# Altium schematic symbol library SCHLIB.SchLib: 2608 symbols (part 6 of 20)
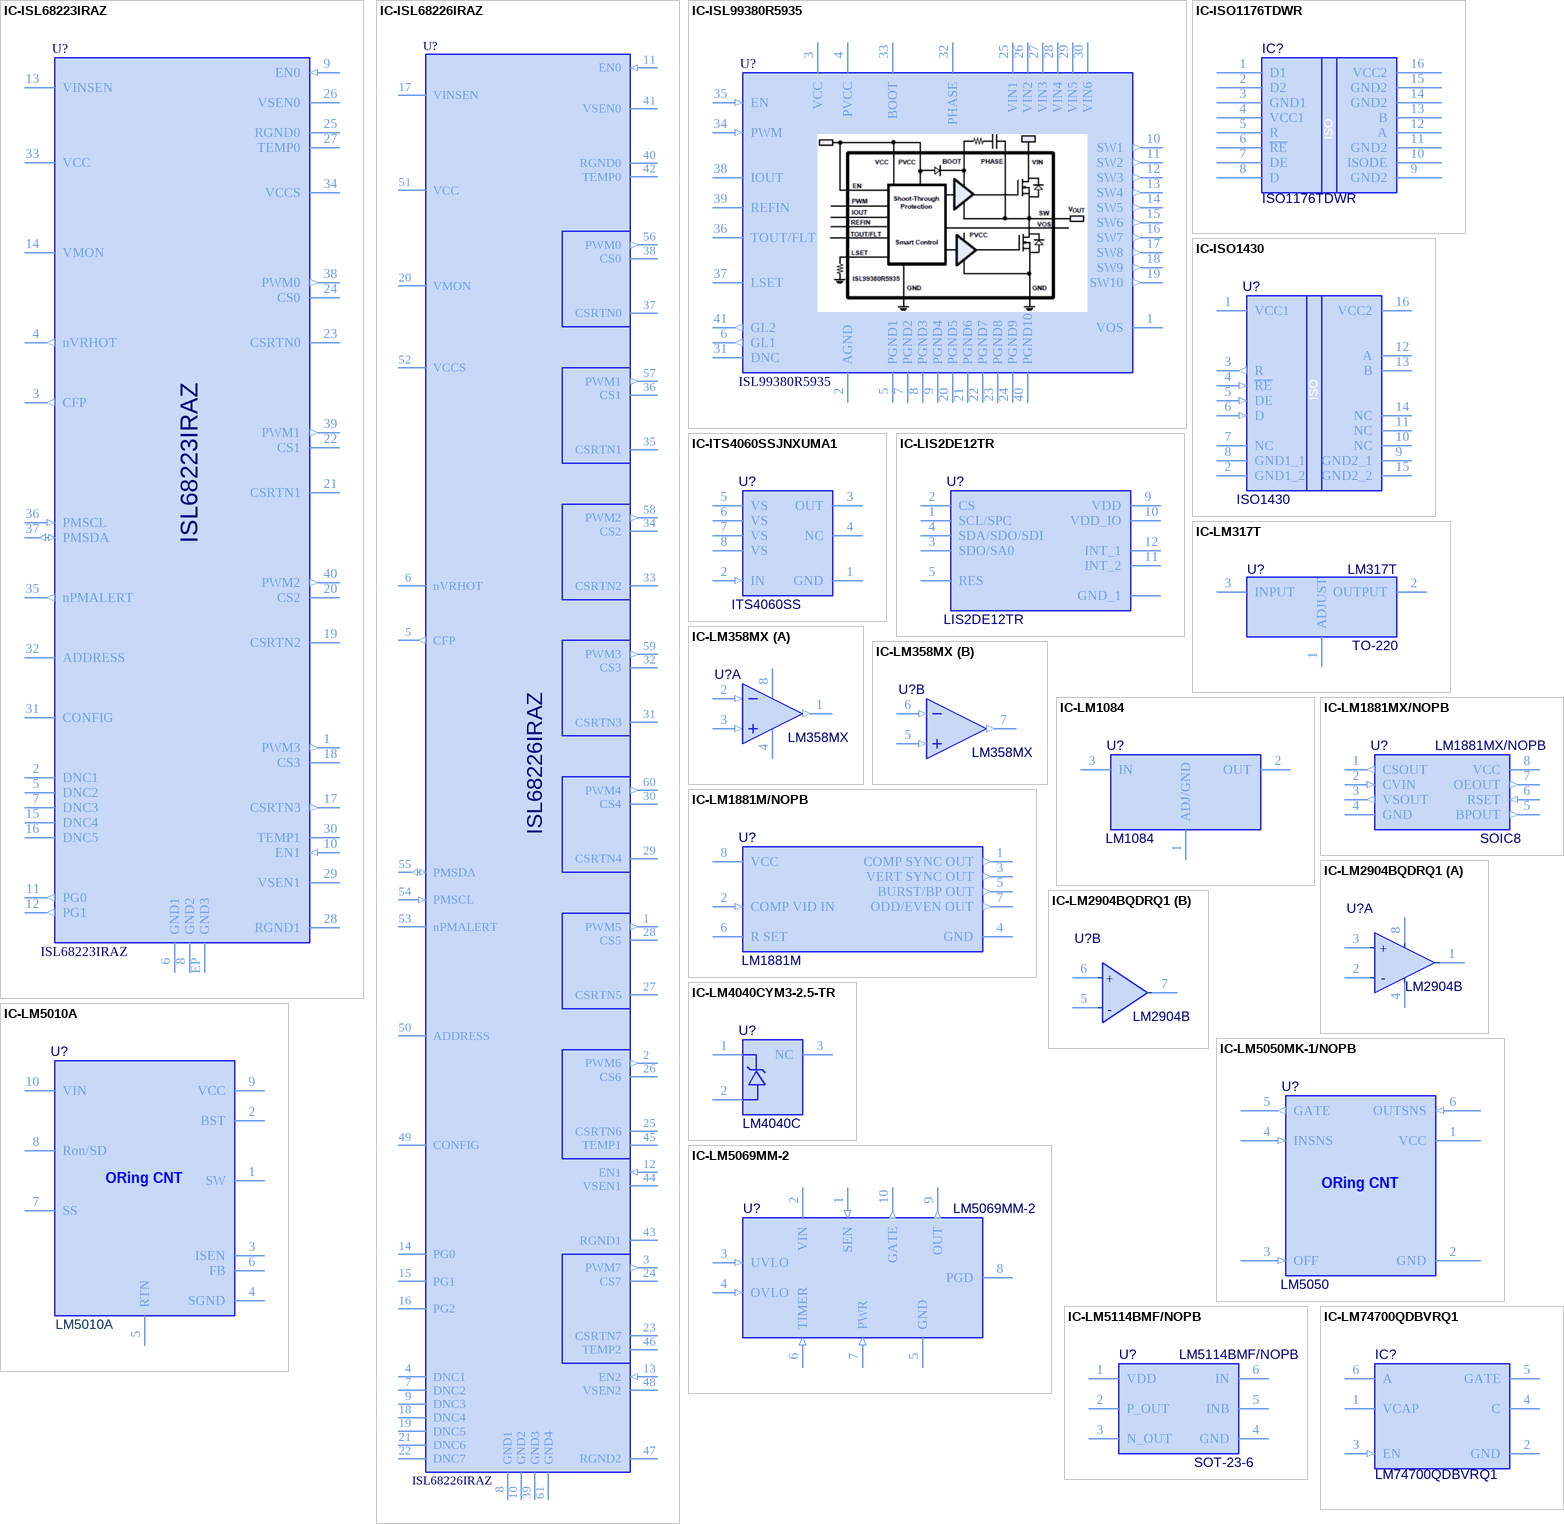
[diagram p88: symbols IC-ISL68223IRAZ to IC-LM74700QDBVRQ1]

## IC-LM358MX
designator U?, comment LM358MX
IC OPAMP GP 8SOIC; Manufacturer: ON Semiconductor / Fairchild; Min Supply Voltage: 3V; Max Supply Voltage: 32V; Min Dual Supply Voltage: 1.5V; Max Dual Supply Voltage: 16V; Voltage Gain: 100dB; Slew Rate: 0.6V/µs; Number of Channels: 2; Common Mode Rejection Ratio: 65dB; Output Current: 30mA; Nominal Supply Current: 1.2mA; Input Bias Current: 250nA; Input Offset Voltage (Vos): 7mV; Operating Supply Current: 800uA; Washability: OK; Supplier 1: Digi-Key; Manufacturer Part Number: LM358MX; Stock 1: 16179; Pricing 1: 1=0.47, 10=0.379, 100=0.2578, 500=0.19332, 1000=0.14499 (USD); Mount: Surface Mount; Number of Pins: 8; Weight: 0.2304g; Min Operating Temperature: 0°C; Max Operating Temperature: 70°C; Packaging: Tape and Reel; Package Quantity: 3000; Operating Supply Voltage: 32V; Number of Circuits: 2; Number of Elements: 2; Power Supply Rejection Ratio (PSRR): 65dB; Number of Amplifiers: 2; Output Current per Channel: 30mA; Length: 4.92mm; Height: 1.55mm; Width: 3.95mm; Radiation Hardening: No; REACH SVHC: No SVHC; Lead Free: Lead Free; Supplier Part Number 1: LM358MXFSDKR-ND; ComponentLink1Description: Datasheet; ComponentLink1URL: https://www.ti.com/lit/ds/symlink/lm158-n.pdf
footprint SOIC8
part A pins: 1 OUT A (out), 2 -IN A (in), 3 +IN A (in), 4 -V (power), 8 +V (power)
part B pins: 5 +IN A (in), 6 -IN A (in), 7 OUT B (out)
1 alternate drawing of the same symbol

## IC-LM1084
designator U?, comment LM1084
IC REG LIN POS ADJ 5A DDPAK; Manufacturer: TI National Semiconductor; Manufacturer Part Number: LM1084IS-ADJ/NOPB; Max Power Dissipation: 30W; Max Input Voltage: 29V; Dropout Voltage: 1.3V; Output Voltage: 15V; Number of Outputs: 1; Min Input Voltage: 2.6V; Reference Voltage: 1.262V; Polarity: Positive; Min Output Voltage: 1.25V; Quiescent Current: 5mA; Output Type: Adjustable; Supplier 1: Digi-Key; Stock 1: 299; Pricing 1: 1=2,85000, 10=2,55600, 25=2,41640, 100=1,98690, 250=1,78284, 500=1,71840, 1000=1,42842, 2500=1,37472, 5000=1,33176 (USD); RoHS: Yes; Mount: Surface Mount; Case/Package: TO-263; Number of Pins: 3; Weight: 0.25lb; Contact Plating: Tin,Matte; Min Operating Temperature: -40°C; Max Operating Temperature: 125°C; Packaging: Rail/Tube; Output Current: 5A; Max Output Current: 5A; Package Quantity: 45; Power Dissipation: 30W; Max Output Voltage: 15V; Current Rating: 5A; Length: 10.16mm; Height: 4.57mm; Width: 8.64mm; Radiation Hardening: No; REACH SVHC: No SVHC; Lead Free: Contains Lead; ComponentLink1URL: https://datasheet.ciiva.com/27050/835577-27050272.pdf?src-supplier=Jameco; ComponentLink1Description: https://datasheet.ciiva.com/27050/835577-27050272.pdf?src-supplier=Jameco; ComponentLink2URL: https://datasheet.ciiva.com/25626/0900766b807800b5-25626829.pdf?src-supplier=RSComponents; ComponentLink2Description: https://datasheet.ciiva.com/25626/0900766b807800b5-25626829.pdf?src-supplier=RSComponents; ComponentLink3URL: https://datasheet.ciiva.com/1511/1887482-1511673.pdf?src-supplier=Element14; ComponentLink3Description: https://datasheet.ciiva.com/1511/1887482-1511673.pdf?src-supplier=Element14; ComponentLink4URL: https://datasheet.ciiva.com/25974/lm1084-25974378.pdf?src-supplier=Avnet+Europe; ComponentLink4Description: https://datasheet.ciiva.com/25974/lm1084-25974378.pdf?src-supplier=Avnet+Europe; ComponentLink5URL: https://datasheet.ciiva.com/3223/lm1084-3223471.pdf?src-supplier=Avnet; ComponentLink5Description: https://datasheet.ciiva.com/3223/lm1084-3223471.pdf?src-supplier=Avnet; Supplier Part Number 1: LM1084IS-ADJ/NOPB-ND
footprint DPAK254P1404X457-4N
pins: 1 ADJ/GND, 2 OUT, 3 IN

## IC-LM1881M/NOPB
designator U?, comment LM1881M
IC VIDEO SYNC SEPARATOR 8SOIC; Manufacturer: TI National Semiconductor; Manufacturer Part Number: LM1881M/NOPB; Min Supply Voltage: 5V; Max Supply Voltage: 12V; Nominal Supply Current: 5.2mA; Power Dissipation: 1.1W; Power Consumption: 25mW; Washability: OK; Supplier 1: Digi-Key; Supplier Part Number 1: LM1881M/NOPB-ND; Stock: 529; Pricing: 1=3.61, 10=3.246, 25=3.0692, 100=2.5234, 250=2.2642, 500=2.1824, 1000=1.8141, 2500=1.7459, 5000=1.6914 (USD); RoHS: Yes; Mount: Surface Mount; Case/Package: SOIC; Number of Pins: 8; Contact Plating: Tin,Matte; Min Operating Temperature: 0°C; Max Operating Temperature: 70°C; Packaging: Rail/Tube; Package Quantity: 95; Voltage: 5V; Max Power Dissipation: 1.1W; Length: 4.9mm; Height: 1.45mm; Width: 3.9mm; Radiation Hardening: No; REACH SVHC: No SVHC; Lead Free: Lead Free; ComponentLink1URL: https://datasheet.ciiva.com/14153/sanat-semico-video-sync-seperator-en-14153233.pdf?src-supplier=Distrelec; ComponentLink1Description: https://datasheet.ciiva.com/14153/sanat-semico-video-sync-seperator-en-14153233.pdf?src-supplier=Distrelec; ComponentLink2URL: https://datasheet.ciiva.com/1172/1839177-1172294.pdf?src-supplier=Element14; ComponentLink2Description: https://datasheet.ciiva.com/1172/1839177-1172294.pdf?src-supplier=Element14; ComponentLink3URL: https://datasheet.ciiva.com/19457/893996-19457288.pdf?src-supplier=Jameco; ComponentLink3Description: https://datasheet.ciiva.com/19457/893996-19457288.pdf?src-supplier=Jameco; ComponentLink4URL: https://datasheet.ciiva.com/15120/getdatasheetpartid-628221-15120012.pdf?src-supplier=Verical; ComponentLink4Description: https://datasheet.ciiva.com/15120/getdatasheetpartid-628221-15120012.pdf?src-supplier=Verical; ComponentLink5URL: https://datasheet.ciiva.com/6622/lm1881-6622173.pdf?src-supplier=Digi-Key; ComponentLink5Description: https://datasheet.ciiva.com/6622/lm1881-6622173.pdf?src-supplier=Digi-Key; ComponentLink6URL: https://datasheet.ciiva.com/48707/001010689-da-01-en-ic-video-sync-se-lm1881m-nopb-soic-8-tid-48707237.pdf?src-supplier=Conrad; ComponentLink6Description: https://datasheet.ciiva.com/48707/001010689-da-01-en-ic-video-sync-se-lm1881m-nopb-soic-8-tid-48707237.pdf?src-supplier=Conrad
footprint D0008A_N (SOIC, 8-Leads, Body 5x4mm, Pitch 1.27mm, IPC Medium Density)
pins: 1 COMP SYNC OUT (out), 2 COMP VID IN (in), 3 VERT SYNC OUT (out), 4 GND (power), 5 BURST/BP OUT (out), 6 R SET, 7 ODD/EVEN OUT (out), 8 VCC (power)

## IC-LM1881MX/NOPB
designator U?, comment LM1881MX/NOPB  Case/Package: SOIC8
IC VIDEO SYNC SEPARATOR 8-SOIC; Manufacturer: TI National Semiconductor; Max Supply Voltage: 5V; Max Power Dissipation: 1.1W; Operating Supply Current: 5.2mA; Power Consumption: 25mW; Washability: OK; Supplier 1: Digi-Key; Manufacturer Part Number: LM1881MX/NOPB; Stock 1: 9639; Pricing 1: 1=3.13, 10=2.809, 100=2.3017, 500=1.95944, 1000=1.65253 (USD); Mount: Surface Mount; Number of Pins: 8; Weight: 0.019048oz; Contact Plating: Tin; Min Operating Temperature: 0°C; Max Operating Temperature: 70°C; Packaging: Tape and Reel; Package Quantity: 2500; Radiation Hardening: No; REACH SVHC: No SVHC; Lead Free: Lead Free; ComponentLink1URL: https://www.verical.com/server-webapp/html/getDatasheet?partID=630017; ComponentLink1Description: https://www.verical.com/server-webapp/html/getDatasheet?partID=630017; ComponentLink2URL: http://www.ti.com/lit/ds/symlink/lm1881.pdf; ComponentLink2Description: http://www.ti.com/lit/ds/symlink/lm1881.pdf; Supplier Part Number 1: 296-47437-6-ND
footprint SOIC8
pins: 1 CSOUT (out), 2 CVIN (in), 3 VSOUT (out), 4 GND (power), 5 BPOUT (out), 6 RSET (in), 7 OEOUT (out), 8 VCC (power)

## IC-LM2904BQDRQ1
designator U?, comment LM2904B
IC OPAMP GP 2 CIRCUIT 8SOIC; Manufacturer: Texas Instruments; Manufacturer Part Number: LM2904BQDRQ1; Supplier 1: Digi-Key; Supplier Part Number 1: 296-LM2904BQDRQ1CT-ND; Stock: 1587; Pricing: 1=0.44, 10=0.375, 25=0.35, 100=0.26, 250=0.22, 500=0.21, 1000=0.155 (USD); RoHS: No; ComponentLink1Description: datasheet; ComponentLink1URL: https://www.ti.com/lit/ds/symlink/lm2904-q1.pdf?HQS=TI-null-null-digikeymode-df-pf-null-wwe&ts=1602145041041
footprint SOIC8-D0008A_M (SOIC, 8-Leads, Body 5x4mm, Pitch 1.27mm, IPC Low Density)
part A pins: 1 OUT1, 2 IN1- (hiz), 3 IN1+ (hiz), 4 V- (power), 8 V+ (power)
part B pins: 5 IN2+ (hiz), 6 IN2- (hiz), 7 OUT2
part A text: +; -
part B text: +; -

## IC-LM4040CYM3-2.5-TR
designator U?, comment LM4040C
IC VREF SHUNT 0.5% SOT23-3; Manufacturer: Microchip; Manufacturer Part Number: LM4040CYM3-2.5-TR; Min Output Voltage: 2.5V; Output Current: 15mA; Temperature Coefficient: 100ppm/°C; Cathode Current: 65uA; Number of Channels: 1; Output Type: Fixed; Supplier 1: Digi-Key; Supplier Part Number 1: 576-1046-1-ND; Stock: 8428; Pricing: 1=0.32, 25=0.26, 100=0.24 (USD); RoHS: Yes; Mount: Surface Mount; Case/Package: TO-236-3; Number of Pins: 3; Min Operating Temperature: -40°C; Max Operating Temperature: 85°C; Packaging: Cut Tape; Reference Voltage: 2.5V; Tolerance: 0.5%; Output Voltage: 2.5V; Reference Type: Shunt; REACH SVHC: No SVHC; Lead Free: Lead Free; ComponentLink1URL: https://datasheet.ciiva.com/16388/mic23051-16388546.pdf?src-supplier=Future+Electronics; ComponentLink1Description: https://datasheet.ciiva.com/16388/mic23051-16388546.pdf?src-supplier=Future+Electronics; ComponentLink2URL: https://datasheet.ciiva.com/1173/1580463-1173207.pdf?src-supplier=Element14; ComponentLink2Description: https://datasheet.ciiva.com/1173/1580463-1173207.pdf?src-supplier=Element14
footprint SOT23-3
pins: 1 +, 2 -, 3 NC

## IC-LM5010A
designator U?, comment LM5010A
IC REG BUCK ADJUSTABLE 1A 10WSON; Manufacturer: TI National Semiconductor; Manufacturer Part Number: LM5010ASD/NOPB; Output Voltage: 70V; Switching Frequency: 1MHz; Number of Outputs: 1; Efficiency: 91%; Min Input Voltage: 6V; Max Input Voltage: 75V; Synchronous Rectifier: No; Min Output Voltage: 2.5V; Quiescent Current: 650uA; Supplier 1: Digi-Key; Stock 1: 6898; Pricing 1: 1=3,43000, 10=3,08000, 25=2,91160, 100=2,39390, 250=2,14804, 500=2,07040 (USD); RoHS: Yes; Mount: Surface Mount; Number of Pins: 10; Contact Plating: Tin,Matte; Min Operating Temperature: -40°C; Max Operating Temperature: 150°C; Max Output Current: 1A; Output Current: 1A; Package Quantity: 1000; Packaging: Tape and Reel; Max Output Voltage: 70V; Output Type: Adjustable; Max Supply Voltage: 75V; Min Supply Voltage: 6V; Frequency: 1MHz; Termination: SMD/SMT; Length: 4mm; Height: 0.8mm; Width: 4mm; Radiation Hardening: No; Lead Free: Lead Free; REACH SVHC: No SVHC; ComponentLink1URL: https://datasheet.ciiva.com/22755/1814939-22755746.pdf?src-supplier=Farnell; ComponentLink1Description: https://datasheet.ciiva.com/22755/1814939-22755746.pdf?src-supplier=Farnell; ComponentLink2URL: https://datasheet.ciiva.com/25627/0900766b810fa582-25627522.pdf?src-supplier=RSComponents; ComponentLink2Description: https://datasheet.ciiva.com/25627/0900766b810fa582-25627522.pdf?src-supplier=RSComponents; ComponentLink3URL: https://datasheet.ciiva.com/27052/1471525-27052267.pdf?src-supplier=Jameco; ComponentLink3Description: https://datasheet.ciiva.com/27052/1471525-27052267.pdf?src-supplier=Jameco; ComponentLink4URL: https://datasheet.ciiva.com/6597/lm5010a-6597237.pdf?src-supplier=Digi-Key; ComponentLink4Description: https://datasheet.ciiva.com/6597/lm5010a-6597237.pdf?src-supplier=Digi-Key; ComponentLink5URL: https://datasheet.ciiva.com/22684/1886233-22684613.pdf?src-supplier=Element14; ComponentLink5Description: https://datasheet.ciiva.com/22684/1886233-22684613.pdf?src-supplier=Element14; ComponentLink6URL: https://datasheet.ciiva.com/6597/lm5010a-6597240.pdf?src-supplier=Digi-Key; ComponentLink6Description: https://datasheet.ciiva.com/6597/lm5010a-6597240.pdf?src-supplier=Digi-Key; ComponentLink7URL: https://datasheet.ciiva.com/3229/lm5010a-3229963.pdf?src-supplier=Avnet; ComponentLink7Description: https://datasheet.ciiva.com/3229/lm5010a-3229963.pdf?src-supplier=Avnet; ComponentLink8URL: https://datasheet.ciiva.com/6597/lm5010a-6597243.pdf?src-supplier=Digi-Key; ComponentLink8Description: https://datasheet.ciiva.com/6597/lm5010a-6597243.pdf?src-supplier=Digi-Key; Supplier Part Number 1: 296-LM5010ASD/NOPBCT-ND
footprint SON80P400X80_HS-11N (SON, 10-Leads, Body 4,00x4,00mm, Pitch 0,80mm, Thermal Pad 3,00x2,09mm, IPC Medium Density)
pins: 1 SW, 2 BST, 3 ISEN, 4 SGND, 5 RTN, 6 FB, 7 SS, 8 Ron/SD, 9 VCC, 10 VIN
text: ORing CNT

## IC-LM5050MK-1/NOPB
designator U?, comment LM5050
IC OR CTRLR N+1 6SOT; Manufacturer: TI National Semiconductor; Manufacturer Part Number: LM5050MK-1/NOPB; Min Supply Voltage: 5V; Max Supply Voltage: 75V; Number of Outputs: 1; Quiescent Current: 400uA; Operating Supply Current: 130uA; Turn-Off Delay Time: 486ns; Output Current: 3.2uA; Washability: OK; Tolerance: 1%; Resistance: 24.9kR; Power Rating: 100mW; Temperature Coefficient: 100ppm/°C; Supplier 1: Digi-Key; Stock 1: 33499; Pricing 1: 1=2.33000, 10=2.09100, 25=1.97240, 100=1.57800, 250=1.38072, 500=1.34126 (USD); RoHS: Yes; Mount: Surface Mount; Case/Package: SOT-23-6; Number of Pins: 6; Min Operating Temperature: -40°C; Max Operating Temperature: 125°C; Packaging: Tape and Reel; Package Quantity: 1000; Nominal Supply Current: 130uA; Number of Drivers: 1; Max Output Current: 3.2uA; Output Voltage: 75V; Radiation Hardening: No; Lead Free: Lead Free; REACH SVHC: No SVHC; ComponentLink1URL: https://datasheet.ciiva.com/22694/1642225-22694320.pdf?src-supplier=Element14; ComponentLink1Description: https://datasheet.ciiva.com/22694/1642225-22694320.pdf?src-supplier=Element14; ComponentLink2URL: https://datasheet.ciiva.com/12085/lm5050-1-122886-12085154.pdf?src-supplier=Mouser; ComponentLink2Description: https://datasheet.ciiva.com/12085/lm5050-1-122886-12085154.pdf?src-supplier=Mouser; ComponentLink3URL: https://datasheet.ciiva.com/1960/lm5050-1-1960856.pdf?src-supplier=Digi-Key; ComponentLink3Description: https://datasheet.ciiva.com/1960/lm5050-1-1960856.pdf?src-supplier=Digi-Key; ComponentLink4URL: https://datasheet.ciiva.com/15110/getdatasheetpartid-319925-15110173.pdf?src-supplier=Verical; ComponentLink4Description: https://datasheet.ciiva.com/15110/getdatasheetpartid-319925-15110173.pdf?src-supplier=Verical; ComponentLink5URL: https://datasheet.ciiva.com/1960/lm5050-1-1960857.pdf?src-supplier=Digi-Key; ComponentLink5Description: https://datasheet.ciiva.com/1960/lm5050-1-1960857.pdf?src-supplier=Digi-Key; ComponentLink6URL: https://datasheet.ciiva.com/1960/lm5050-1-1960858.pdf?src-supplier=Digi-Key; ComponentLink6Description: https://datasheet.ciiva.com/1960/lm5050-1-1960858.pdf?src-supplier=Digi-Key; Supplier Part Number 1: LM5050MK-1/NOPBCT-ND; Stock: 149638; Pricing: 1=0.1, 10=0.016, 100=0.0065, 1000=0.0029, 2500=0.0025 (USD); Case Code (Imperial): 0603; Contact Plating: Tin,Matte; Case Code (Metric): 1608; Composition: Thick Film; Number of Terminations: 2; Max Power Dissipation: 100mW; Features: Automotive AEC-Q200; Length: 0.061inch; Height: 0.022inch; Width: 0.031inch; ComponentLink7URL: http://components.arrow.com/part/dataview/50576347S797719N1174?src-supplier=Arrow; ComponentLink7Description: http://components.arrow.com/part/dataview/50576347S797719N1174?src-supplier=Arrow; ComponentLink8URL: http://www.seielect.com/Catalog/SEI-RMC.pdf?src-supplier=Future+Electronics; ComponentLink8Description: http://www.seielect.com/Catalog/SEI-RMC.pdf?src-supplier=Future+Electronics; ComponentLink9URL: https://www.seielect.com/catalog/SEI-RMCF_RMCP.pdf?src-supplier=Avnet; ComponentLink9Description: https://www.seielect.com/catalog/SEI-RMCF_RMCP.pdf?src-supplier=Avnet; ComponentLink10URL: https://www.seielect.com/catalog/SEI-Packaging.pdf?src-supplier=Digi-Key; ComponentLink10Description: https://www.seielect.com/catalog/SEI-Packaging.pdf?src-supplier=Digi-Key; ComponentLink11URL: https://www.seielect.com/catalog/SEI-RMCF_RMCP.pdf?src-supplier=Avnet+Asia; ComponentLink11Description: https://www.seielect.com/catalog/SEI-RMCF_RMCP.pdf?src-supplier=Avnet+Asia; ComponentLink12URL: https://www.seielect.com/Catalog/SEI-RMCF_RMCP.pdf?src-supplier=Digi-Key; ComponentLink12Description: https://www.seielect.com/Catalog/SEI-RMCF_RMCP.pdf?src-supplier=Digi-Key
footprint SOT23-6
pins: 1 VCC (power), 2 GND (power), 3 OFF (in), 4 INSNS (in), 5 GATE (out), 6 OUTSNS (in)
text: ORing CNT

## IC-LM5069MM-2
designator U?, comment LM5069MM-2
Hot Swap Controller 1-CH 80V N-Channel Positive High Voltage 10-Pin VSSOP T/R; Manufacturer: National Semiconductor; Manufacturer Part Number: LM5069MM-2/NOPB; PackageTopMarking: ZXTT*SNBB; PowerWise: N; CompType: MiscPower; High-Reliability: Y; Min Supply Voltage: 9V; Number of Channels: 1; Output Voltage: 12V; Washability: OK; DatasheetVersion: Mar-2008; PackageVersion: revB, Jul-2003; PackageReference: MUB10A; PackageDescription: Mini-SO, Molded, .118 x .118 x .034in Body, 10 Lead, .0197in Pitch; PartNumber: LM5069MM-2; RoHS: N; PinCount: 10; Code_JEDEC: MO-187-BA; ComponentLink1Description: Manufacturer URL; ComponentLink1URL: http://www.national.com/; ComponentLink2Description: LM5069 Datasheet; ComponentLink2URL: http://www.national.com/ds/LM/LM5069.pdf; ComponentLink3Description: LM5069 Web Page; ComponentLink3URL: http://www.national.com/pf/LM/LM5069.html; ComponentLink4Description: MUB10A Package Page; ComponentLink4URL: http://www.national.com/packaging/folders/mub10a.html; Supplier 1: Digi-Key; Stock 1: 60493; Pricing 1: 1 = 3.00000, 10 = 2.69700, 100 = 2.20940, 500 = 1.88078 (USD); Mount: Surface Mount; Case/Package: MSOP; Number of Pins: 10; Min Operating Temperature: -40°C; Max Operating Temperature: 125°C; Packaging: Tape and Reel; Package Quantity: 1000; Max Supply Voltage: 80V; Number of Outputs: 1; Length: 3mm; Height: 0.86mm; Depth: 3.1mm; Width: 3mm; Radiation Hardening: No; Lead Free: Lead Free; REACH SVHC: No SVHC; ComponentLink5URL: https://datasheet.ciiva.com/15099/getdatasheetpartid-628880-15099677.pdf?src-supplier=Verical; ComponentLink5Description: https://datasheet.ciiva.com/15099/getdatasheetpartid-628880-15099677.pdf?src-supplier=Verical; ComponentLink6URL: https://datasheet.ciiva.com/3222/lm5069-3222438.pdf?src-supplier=Avnet; ComponentLink6Description: https://datasheet.ciiva.com/3222/lm5069-3222438.pdf?src-supplier=Avnet; ComponentLink7URL: https://datasheet.ciiva.com/3222/lm5069-3222470.pdf?src-supplier=Avnet; ComponentLink7Description: https://datasheet.ciiva.com/3222/lm5069-3222470.pdf?src-supplier=Avnet; ComponentLink8URL: https://datasheet.ciiva.com/6609/lm5069-6609670.pdf?src-supplier=Digi-Key; ComponentLink8Description: https://datasheet.ciiva.com/6609/lm5069-6609670.pdf?src-supplier=Digi-Key; ComponentLink9URL: https://datasheet.ciiva.com/1511/1642228-1511437.pdf?src-supplier=Element14; ComponentLink9Description: https://datasheet.ciiva.com/1511/1642228-1511437.pdf?src-supplier=Element14; Supplier Part Number 1: LM5069MM-2/NOPBCT-ND
footprint MUB10A_N (TSSOP, 10-Leads, Body 3x3mm, Pitch 0.5mm, IPC Medium Density)
footprint MUB10A_L (TSSOP, 10-Leads, Body 3x3mm, Pitch 0.5mm, IPC High Density)
footprint MUB10A_M (TSSOP, 10-Leads, Body 3x3mm, Pitch 0.5mm, IPC Low Density)
pins: 1 SEN (in), 2 VIN (power), 3 UVLO (in), 4 OVLO (in), 5 GND (power), 6 TIMER (in), 7 PWR (in), 8 PGD (oc), 9 OUT (out), 10 GATE (out)

## IC-LM5114BMF/NOPB
designator U?, comment LM5114BMF/NOPB  Case/Package: SOT-23-6
IC MOSFET GATE DVR 7.6A SOT23-6; Manufacturer: TI National Semiconductor; Rise Time: 3.2ns; Propagation Delay: 14ns; Max Supply Voltage: 12.6V; Min Supply Voltage: 4V; Number of Outputs: 2; Channel Type: Single; Number of Drivers: 1; Fall Time: 8ns; Drain to Source Voltage (Vdss): 100V; Continuous Drain Current (ID): 200A; Rds On Max: 2.4mR; Input Capacitance: 12nF; Max Power Dissipation: 375W; Turn-Off Delay Time: 32ns; Gate to Source Voltage (Vgs): 20V; Washability: OK; Supplier 1: Digi-Key; Manufacturer Part Number: LM5114BMF/NOPB; Stock 1: 14082; Pricing 1: 1=1.6, 10=1.441, 100=1.1584, 500=0.95172 (USD); Mount: Surface Mount; Number of Pins: 6; Min Operating Temperature: -40°C; Max Operating Temperature: 125°C; Max Output Current: 7.6A; Packaging: Tape and Reel; Output Current: 7.6A; Nominal Supply Current: 7.6A; Package Quantity: 1000; Turn-On Delay Time: 14ns; Element Configuration: Single; Number of Channels: 1; REACH SVHC: No SVHC; Lead Free: Lead Free; ComponentLink1URL: http://www.ti.com/lit/ds/symlink/lm5114.pdf?src-supplier=Digi-Key; ComponentLink1Description: http://www.ti.com/lit/ds/symlink/lm5114.pdf?src-supplier=Digi-Key; ComponentLink2URL: http://www.farnell.com/datasheets/1882602.pdf?src-supplier=Element14; ComponentLink2Description: http://www.farnell.com/datasheets/1882602.pdf?src-supplier=Element14; ComponentLink3URL: http://www.farnell.com/datasheets/1604991.pdf?src-supplier=Farnell; ComponentLink3Description: http://www.farnell.com/datasheets/1604991.pdf?src-supplier=Farnell; Supplier Part Number 1: LM5114BMF/NOPBDKR-ND; RoHS: Yes; Contact Plating: Tin; ComponentLink4URL: http://www.ti.com/lit/ds/symlink/csd19536ktt.pdf?src-supplier=Digi-Key; ComponentLink4Description: http://www.ti.com/lit/ds/symlink/csd19536ktt.pdf?src-supplier=Digi-Key; ComponentLink5URL: http://www.ti.com/general/docs/lit/getliterature.tsp?genericPartNumber=CSD19536KTT&&fileType=pdf&src-supplier=Avnet; ComponentLink5Description: http://www.ti.com/general/docs/lit/getliterature.tsp?genericPartNumber=CSD19536KTT&&fileType=pdf&src-supplier=Avnet; ComponentLink6URL: http://www.ti.com/lit/gpn/csd19536ktt?src-supplier=Mouser; ComponentLink6Description: http://www.ti.com/lit/gpn/csd19536ktt?src-supplier=Mouser
footprint SOT23-6
pins: 1 VDD (power), 2 P_OUT, 3 N_OUT, 4 GND, 5 INB, 6 IN

## IC-LM74700QDBVRQ1
designator IC?, comment LM74700QDBVRQ1
Low Iq, ideal diode controller 6-SOT-23 -40 to 125; Manufacturer: Texas Instruments; Supplier 1: Arrow; Manufacturer Part Number: LM74700QDBVRQ1; Stock 1: 75000; Pricing 1: 3000=0,81160, 6000=0,77810, 9000=0,75810, 3000=0,82740, 6000=0,79130, 9000=0,77010, 3000=0,99430, 30000=0,98380, 300000=0,92110, 1500000=0,88660, 3000000=0,88620 (USD); RoHS: No; Min Operating Temperature: -40°C; Max Operating Temperature: 125°C; Supplier Part Number 1: LM74700QDBVRQ1
footprint SOT23-6 - LM74700 (LM74700)
pins: 1 VCAP (power), 2 GND (power), 3 EN (in), 4 C, 5 GATE, 6 A

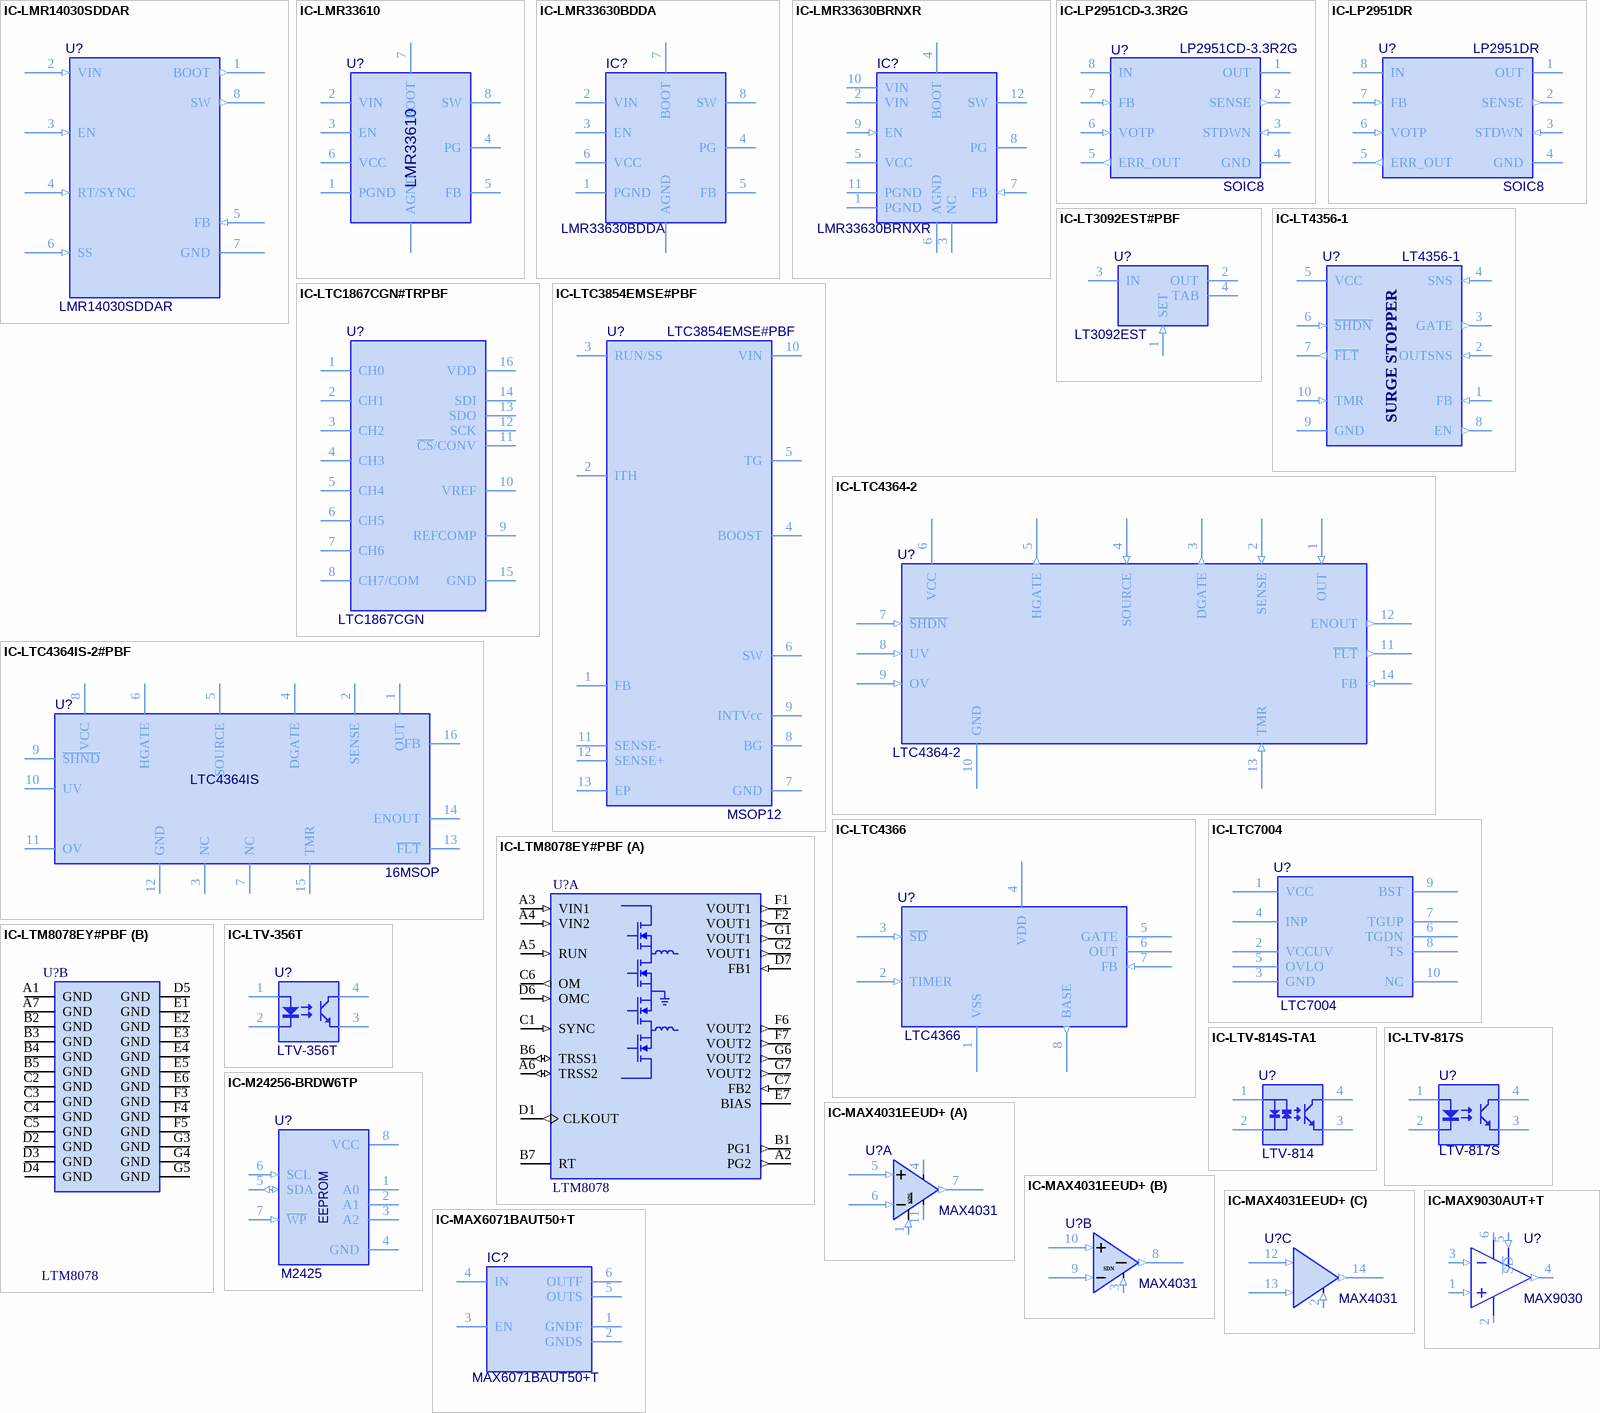
[diagram p20: symbols IC-LMR14030SDDAR to IC-MAX9030AUT+T]

## IC-LMR14030SDDAR
designator U?, comment LMR14030SDDAR
IC REG BUCK ADJ 3.5A 8SOPWR; MF: Texas Instruments; Quiescent Current: 40uA; Switching Frequency: 2.5MHz; Output Voltage: 28V; Number of Outputs: 1; Min Input Voltage: 4V; Max Input Voltage: 40V; Output Type: Adjustable; Price: None; Package: HSOIC-8 Texas Instruments; MP: LMR14030SDDAR; Availability: Good; Supplier 1: Digi-Key; Manufacturer: Texas Instruments; Manufacturer Part Number: LMR14030SDDAR; Stock 1: 7894; Pricing 1: 1=2,73000, 10=2,44900, 25=2,31000, 100=1,84800, 250=1,61700, 500=1,57080, 1000=1,24740 (USD); RoHS: Yes; Mount: Surface Mount; Number of Pins: 8; Contact Plating: Gold,Silver; Min Operating Temperature: -40°C; Max Operating Temperature: 125°C; Max Output Current: 3.5A; Operating Supply Voltage: 40V; Lead Free: Lead Free; ComponentLink1URL: http://www.ti.com/general/docs/lit/getliterature.tsp?genericPartNumber=LMR14030&&fileType=pdf&src-supplier=Avnet; ComponentLink1Description: http://www.ti.com/general/docs/lit/getliterature.tsp?genericPartNumber=LMR14030&&fileType=pdf&src-supplier=Avnet; ComponentLink2URL: http://www.ti.com/lit/ds/symlink/lmr14030.pdf?src-supplier=Digi-Key; ComponentLink2Description: http://www.ti.com/lit/ds/symlink/lmr14030.pdf?src-supplier=Digi-Key; ComponentLink3URL: http://www.ti.com/general/docs/suppproductinfo.tsp?distId=10&amp;gotoUrl=http%3A%2F%2Fwww.ti.com%2Flit%2Fgpn%2Flmr14030&src-supplier=Digi-Key; ComponentLink3Description: http://www.ti.com/general/docs/suppproductinfo.tsp?distId=10&amp;gotoUrl=http%3A%2F%2Fwww.ti.com%2Flit%2Fgpn%2Flmr14030&src-supplier=Digi-Key; ComponentLink4URL: http://www.ti.com/general/docs/lit/getliterature.tsp?genericPartNumber=LMR14030&amp;&amp;fileType=pdf&src-supplier=Avnet+Asia; ComponentLink4Description: http://www.ti.com/general/docs/lit/getliterature.tsp?genericPartNumber=LMR14030&amp;&amp;fileType=pdf&src-supplier=Avnet+Asia; Supplier Part Number 1: 296-44321-1-ND
footprint SOIC127P600X170_HS-9N (SOIC, 8-Leads, Body 4,90x3,90mm, Pitch 1,27mm, Thermal Pad 3,10x2,40mm, IPC Medium Density)
pins: 1 BOOT (out), 2 VIN (in), 3 EN (in), 4 RT/SYNC (in), 5 FB (in), 6 SS (in), 7 GND (power), 8 SW (out)

## IC-LMR33610
designator U?, comment LMR33610
36V 1A 1.4MHZ REGULATOR; Manufacturer: Texas Instruments; Manufacturer Part Number: LMR33610BDDAR; Supplier 1: Digi-Key; Supplier Part Number 1: 296-LMR33610BDDARCT-ND; Stock: 2245; Pricing: 1=1.77, 10=1.59, 25=1.5, 100=1.2, 250=1.05, 500=1.02, 1000=0.81 (USD); RoHS: No; ComponentLink1Description: datasheet; ComponentLink1URL: https://www.ti.com/lit/ds/symlink/lmr33610.pdf?HQS=TI-null-null-digikeymode-df-pf-null-wwe&ts=1604939284459
footprint SOIC8-EP (SOIC, 8-Leads, Body 5x4mm, Pitch 1.27mm, IPC Low Density)
pins: 1 PGND, 2 VIN, 3 EN, 4 PG, 5 FB, 6 VCC, 7 BOOT, 8 SW, EP AGND

## IC-LMR33630BDDA
designator IC?, comment LMR33630BDDA
SIMPLE SWITCHER 3.8V TO 36V, 3A; Manufacturer: Texas Instruments; Output Type: Adjustable; Output Configuration: Positive; Number of Outputs: 1; Min Output Voltage: 1V; Max Output Voltage: 24V; Switching Frequency: 1.4MHz; Synchronous Rectifier: Yes; Supplier 1: Mouser; Manufacturer Part Number: LMR33630BDDA; Stock 1: 299; Pricing 1: 1=2,65000, 10=2,24000, 100=1,80000, 250=1,57000, 500=1,53000, 1000=1,21000 (USD); RoHS: No; Mount: Surface Mount; Number of Pins: 8; Min Operating Temperature: -40°C; Max Operating Temperature: 125°C; Packaging: Rail/Tube; Min Input Voltage: 3.8V; Max Input Voltage: 36V; Output Current: 3A; ComponentLink1URL: http://www.ti.com/lit/ds/symlink/lmr33630.pdf?src-supplier=Digi-Key; ComponentLink1Description: http://www.ti.com/lit/ds/symlink/lmr33630.pdf?src-supplier=Digi-Key; Supplier Part Number 1: 595-LMR33630BDDA
footprint SOIC8-EP (SOIC, 8-Leads, Body 5x4mm, Pitch 1.27mm, IPC Low Density)
pins: 1 PGND, 2 VIN, 3 EN, 4 PG, 5 FB, 6 VCC, 7 BOOT, 8 SW, EP AGND

## IC-LMR33630BRNXR
designator IC?, comment LMR33630BRNXR
SIMPLE SWITCHER® 3.8V to 36V, 3A Synchronous Buck Converter With Ultra-Low EMI 12-VQFN-HR -40 to 125; Manufacturer: Texas Instruments; Output Type: Adjustable; Output Configuration: Positive; Number of Outputs: 1; Min Output Voltage: 1V; Max Output Voltage: 24V; Switching Frequency: 1.4MHz; Synchronous Rectifier: Yes; Supplier 1: Arrow; Manufacturer Part Number: LMR33630BRNXR; Stock 1: 3000; Pricing 1: 3000=0,89540, 1=2,16400, 10=1,86100, 25=1,82200, 100=1,81300, 250=1,80500, 500=1,79600, 1000=1,78700, 3000=0,99750, 30000=0,98590, 300000=0,91760, 1500000=0,88120, 3000000=0,88090 (USD); RoHS: No; Mount: Surface Mount; Case/Package: VQFN; Number of Pins: 12; Min Operating Temperature: -40°C; Max Operating Temperature: 125°C; Packaging: Cut Tape; Min Input Voltage: 3.8V; Max Input Voltage: 36V; Output Current: 3A; ComponentLink1URL: http://www.ti.com/lit/ds/symlink/lmr33630.pdf?src-supplier=Digi-Key; ComponentLink1Description: http://www.ti.com/lit/ds/symlink/lmr33630.pdf?src-supplier=Digi-Key; Supplier Part Number 1: LMR33630BRNXR
footprint VQFN-HR-12 (RNX0012B)
pins: 1 PGND (power), 2 VIN (power), 3 NC, 4 BOOT, 5 VCC (power), 6 AGND (power), 7 FB (in), 8 PG (oc), 9 EN (in), 10 VIN (power), 11 PGND (power), 12 SW (power)

## IC-LP2951CD-3.3R2G
designator U?, comment LP2951CD-3.3R2G  Case/Package: SOIC8
IC REG LINEAR 3.3V 100MA 8SOIC; Manufacturer: ON Semiconductor; Max Input Voltage: 30V; Number of Outputs: 1; Dropout Voltage: 350mV; Min Input Voltage: 4.3V; Input Bias Current: 75uA; Reference Voltage: 1.26V; Polarity: Positive; Accuracy: 1%; Output Type: Fixed; Washability: OK; Supplier 1: Digi-Key; Manufacturer Part Number: LP2951CD-3.3R2G; Stock 1: 2160; Pricing 1: 1=0.52, 10=0.444, 100=0.3317, 500=0.2606, 1000=0.20137 (USD); Mount: Surface Mount; Number of Pins: 8; Contact Plating: Matte,Tin; Min Operating Temperature: -40°C; Max Operating Temperature: 125°C; Max Output Current: 100mA; Output Voltage: 3.3V; Packaging: Tape and Reel; Output Current: 100mA; Nominal Output Voltage: 3.3V; Package Quantity: 1; Number of Regulators: 1; Min Output Voltage: 3.3V; Quiescent Current: 75uA; Output Voltage Accuracy: 1%; Length: 5mm; Height: 1.5mm; Width: 4mm; Radiation Hardening: No; REACH SVHC: No SVHC; Lead Free: Lead Free; Halogen Free: Halogen Free; ComponentLink1URL: http://www.onsemi.com/pub/Collateral/LP2950-D.PDF; ComponentLink1Description: http://www.onsemi.com/pub/Collateral/LP2950-D.PDF; ComponentLink2URL: https://www.alliedelec.com/m/d/1d3b576a6ffe6978fe274d93b947e751.PDF; ComponentLink2Description: https://www.alliedelec.com/m/d/1d3b576a6ffe6978fe274d93b947e751.PDF; ComponentLink3URL: http://www.onsemi.jp/pub/Collateral/LP2950-D.PDF; ComponentLink3Description: http://www.onsemi.jp/pub/Collateral/LP2950-D.PDF; Supplier Part Number 1: LP2951CD-3.3R2GOSDKR-ND
footprint SOIC8
pins: 1 OUT, 2 SENSE (out), 3 STDWN (in), 4 GND (power), 5 ERR_OUT (out), 6 VOTP (in), 7 FB (in), 8 IN (power)

## IC-LP2951DR
designator U?, comment LP2951DR  Case/Package: SOIC8
IC REG LDO 5V/ADJ 0.1A 8SOIC; Manufacturer: Texas Instruments; Output Current: 100mA; Dropout Voltage: 380mV; Number of Outputs: 1; Output Voltage: 30V; Min Input Voltage: 2V; Reference Voltage: 1.252V; Polarity: Positive; Min Output Voltage: 1.2V; Max Output Voltage: 29V; Output Voltage Accuracy: 1.4%; Quiescent Current: 75uA; Output Type: Adjustable; Washability: OK; Supplier 1: Digi-Key; Manufacturer Part Number: LP2951DR; Stock 1: 29021; Pricing 1: 1=0.6, 10=0.527, 100=0.4039, 500=0.3193, 1000=0.25544 (USD); Number of Pins: 8; Contact Plating: Gold; Min Operating Temperature: -40°C; Max Operating Temperature: 125°C; Package Quantity: 1; Max Output Current: 100mA; Packaging: Tape and Reel; Max Input Voltage: 30V; Accuracy: 1.4%; Number of Regulators: 1; Input Bias Current: 75uA; Radiation Hardening: No; Lead Free: Lead Free; REACH SVHC: No SVHC; ComponentLink1URL: http://www.farnell.com/datasheets/1837623.pdf; ComponentLink1Description: http://www.farnell.com/datasheets/1837623.pdf; ComponentLink2URL: https://www.verical.com/server-webapp/html/getDatasheet?partID=111801; ComponentLink2Description: https://www.verical.com/server-webapp/html/getDatasheet?partID=111801; ComponentLink3URL: http://www.ti.com/lit/ds/symlink/lp2951.pdf; ComponentLink3Description: http://www.ti.com/lit/ds/symlink/lp2951.pdf; ComponentLink4URL: http://focus.ti.com/lit/ds/symlink/lp2951-33.pdf; ComponentLink4Description: http://focus.ti.com/lit/ds/symlink/lp2951-33.pdf; ComponentLink5URL: http://www.ti.com/general/docs/lit/getliterature.tsp?genericPartNumber=LP2950-50&&fileType=pdf; ComponentLink5Description: http://www.ti.com/general/docs/lit/getliterature.tsp?genericPartNumber=LP2950-50&&fileType=pdf; ComponentLink6URL: http://www.produktinfo.conrad.com/datenblaetter/1000000-1099999/001014286-da-01-en-IC_REG_LDO_ADJ_0_1A_LP2951DR_SOIC_8_TID.pdf; ComponentLink6Description: http://www.produktinfo.conrad.com/datenblaetter/1000000-1099999/001014286-da-01-en-IC_REG_LDO_ADJ_0_1A_LP2951DR_SOIC_8_TID.pdf; Supplier Part Number 1: 296-22748-6-ND
footprint SOIC8
pins: 1 OUT, 2 SENSE (out), 3 STDWN (in), 4 GND (power), 5 ERR_OUT (out), 6 VOTP (in), 7 FB (in), 8 IN (power)

## IC-LT3092EST#PBF
designator U?, comment LT3092EST